# Altium footprint library connector.PcbLib: 227 footprints (part 1 of 15)
Each footprint in its own frame and in the unit in brackets; x right, y up, seen from the top. Pads: shape width x height; smd on the part's side, far side on the other; paste and mask are expansions set on the pad; w line width, h text height; cw(c..) or ccw(c..) is an arc to the next point about the centre after c.
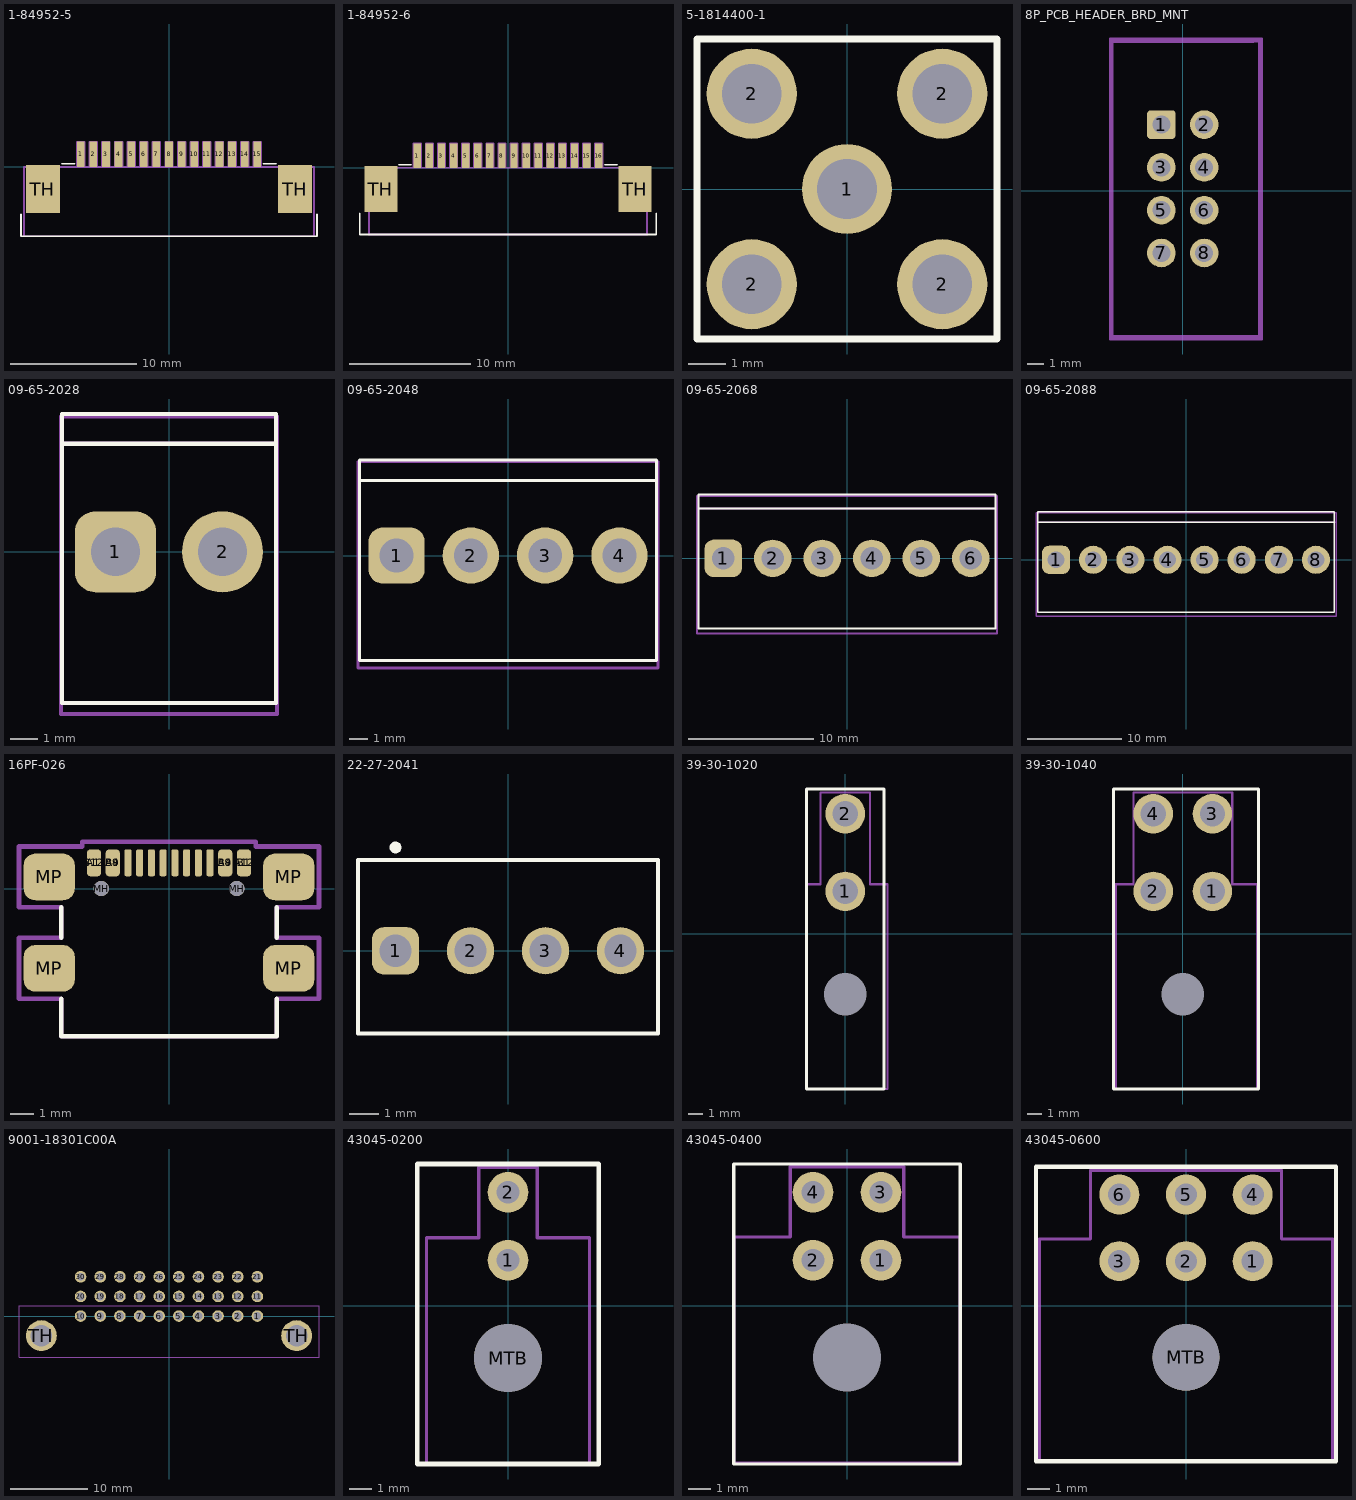
[diagram p0: the footprints below, top view; thin cyan lines are the x and y axes]

## 1-84952-5 [mm]
height 2.6
pads (17):
  rect 0.61x2 smd: 1(-7,1) 2(-6,1) 3(-5,1) 4(-4,1) 5(-3,1) 6(-2,1) 7(-1,1) 8(0,1) 9(1,1) 10(2,1) 11(3,1) 12(4,1) 13(5,1) 14(6,1) 15(7,1)
  rect 2.7x3.8 smd: TH(-10,-1.75) TH(10,-1.75)
Top Overlay:
  lines w0.15: -11.75,-3.75 -11.75,-5.5 0.5,-5.5 11.75,-5.5 11.75,-3.75 ; -8.5,0.25 -7.5,0.25 ; 7.5,0.25 8.5,0.25
Mechanical 29:
  lines w0.15: -7.3,0 -7.3,2 -6.7,2 -6.7,0 ; -6.3,0 -6.3,2 -5.7,2 -5.7,0 ; -5.3,0 -5.3,2 -4.7,2 -4.7,0 ; -4.3,0 -4.3,2 -3.7,2 -3.7,0 ; -3.3,0 -3.3,2 -2.7,2 -2.7,0 ; -2.3,0 -2.3,2 -1.7,2 -1.7,0 ; -1.3,0 -1.3,2 -0.7,2 -0.7,0 ; -0.3,0 -0.3,2 0.3,2 0.3,0 ; 0.7,0 0.7,2 1.3,2 1.3,0 ; 1.7,0 1.7,2 2.3,2 2.3,0 ; 2.7,0 2.7,2 3.3,2 3.3,0 ; 3.7,0 3.7,2 4.3,2 4.3,0 ; 4.7,0 4.7,2 5.3,2 5.3,0 ; 5.7,0 5.7,2 6.3,2 6.3,0 ; 6.7,0 6.7,2 7.3,2 7.3,0 ; -11.5,-5.5 11.5,-5.5 11.5,0 -11.5,0 -11.5,-5.5

## 1-84952-6 [mm]
height 2.6
pads (18):
  rect 0.61x2 smd: 1(-7.5,1) 2(-6.5,1) 3(-5.5,1) 4(-4.5,1) 5(-3.5,1) 6(-2.5,1) 7(-1.5,1) 8(-0.5,1) 9(0.5,1) 10(1.5,1) 11(2.5,1) 12(3.5,1) 13(4.5,1) 14(5.5,1) 15(6.5,1) 16(7.5,1)
  rect 2.7x3.8 smd: TH(-10.5,-1.75) TH(10.5,-1.75)
Top Overlay:
  lines w0.15: -12.25,-3.75 -12.25,-5.5 0.5,-5.5 12.25,-5.5 12.25,-3.75 ; -9,0.25 -8,0.25 ; 8,0.25 9,0.25
Mechanical 29:
  lines w0.15: -7.8,0 -7.8,2 -7.2,2 -7.2,0 ; -6.8,0 -6.8,2 -6.2,2 -6.2,0 ; -5.8,0 -5.8,2 -5.2,2 -5.2,0 ; -4.8,0 -4.8,2 -4.2,2 -4.2,0 ; -3.8,0 -3.8,2 -3.2,2 -3.2,0 ; -2.8,0 -2.8,2 -2.2,2 -2.2,0 ; -1.8,0 -1.8,2 -1.2,2 -1.2,0 ; -0.8,0 -0.8,2 -0.2,2 -0.2,0 ; 0.2,0 0.2,2 0.8,2 0.8,0 ; 1.2,0 1.2,2 1.8,2 1.8,0 ; 2.2,0 2.2,2 2.8,2 2.8,0 ; 3.2,0 3.2,2 3.8,2 3.8,0 ; 4.2,0 4.2,2 4.8,2 4.8,0 ; 5.2,0 5.2,2 5.8,2 5.8,0 ; 6.2,0 6.2,2 6.8,2 6.8,0 ; 7.2,0 7.2,2 7.8,2 7.8,0 ; -11.5,-5.5 -11.5,0 11.5,0 11.5,-5.5 -11.5,-5.5
  text ".Designator" at -2.5,-2.3 h1

## 5-1814400-1 [mm] "TE, SMA Connector Jack, Female Socket 50 Ohm Through Hole, Right Angle Solder"
height 10.43
pads (5):
  round 2.4 hole 1.6: 1(0,0) 2(-2.54,-2.54) 2(-2.54,2.54) 2(2.54,-2.54) 2(2.54,2.54)
Top Overlay:
  lines w0.2: -4,-4 4,-4 4,4 -4,4 -4,-4
3D body "c-5-1814400-1-d-3d.stp": height 10.43, standoff -3.1, extent -3.163,-11.05 3.164,3.15

## 8P_PCB_HEADER_BRD_MNT [mm] "HEADER BRD MNT 8POS 2.54MM"
height 10
pads (8):
  rrect25% 1.7x1.7 hole 1.067: 1(-1.27,3.937)
  round 1.7 hole 1.067: 2(1.27,3.937) 3(-1.27,1.397) 4(1.27,1.397) 5(-1.27,-1.143) 6(1.27,-1.143) 7(-1.27,-3.683) 8(1.27,-3.683)
Mechanical 15:
  lines w0.15: -4.318,-8.788 -4.318,9.017 4.699,9.017 4.699,-8.788 -4.318,-8.788
Mechanical 29:
  circle w0.15: c-1.27,3.937 r0.554
  circle w0.15: c1.27,3.937 r0.554
  circle w0.15: c-1.27,1.397 r0.554
  circle w0.15: c1.27,1.397 r0.554
  circle w0.15: c1.27,-1.143 r0.554
  circle w0.15: c1.27,-3.683 r0.554
  circle w0.15: c-1.27,-3.683 r0.554
  circle w0.15: c-1.27,-1.143 r0.554
  circle w0.15: c-1.27,1.397 r0.554
  lines w0.15: -4.064,-8.636 4.191,-8.636 ; -4.064,8.865 4.191,8.865 ; -4.225,-8.625 4.55,-8.625 4.55,8.9 -4.225,8.9 -4.225,-8.625 ; -4.191,-8.636 -4.191,8.89 4.572,8.89 4.572,-8.636 -4.191,-8.636
  text ".Designator" at -3,6.7 h1
3D body "User Library-8 pin IDC shrouded header V2.step": height 9.18, standoff -2.97, extent -4.475,-8.74 4.725,9.04

## 09-65-2028 [mm]
pads (2):
  rrect50% 3x3 hole 1.8: 1(-1.98,0)
  round 3 hole 1.8: 2(1.98,0)
Top Overlay:
  lines w0.15: -3.96,4 3.96,4 ; -3.96,-5.6 3.96,-5.6 3.96,5.1 -3.96,5.1 -3.96,-5.6
Mechanical 29:
  lines w0.15: -4,4 4,4 ; -4,-6 -4,5 4,5 4,-6 -4,-6
  text ".Designator" at -3.5,-0.3 h1
3D body "009652028.stp": height 13.85, standoff -3.6, extent -3.58,-5.6 3.58,5.15

## 09-65-2048 [mm]
height 12
pads (4):
  rrect50% 3x3 hole 1.8: 1(-5.94,0)
  round 3 hole 1.8: 2(-1.98,0) 3(1.98,0) 4(5.94,0)
Top Overlay:
  lines w0.15: -7.92,4 7.92,4 ; -7.92,-5.6 7.92,-5.6 7.92,5.1 -7.92,5.1 -7.92,-5.6
Mechanical 29:
  lines w0.15: 8,4 -8,4 -8,5 ; -8,5 8,5 8,-6 -8,-6 -8,5
  text ".Designator" at -3.5,-0.8 h1
3D body "009652048.stp": height 13.85, standoff -3.6, extent -7.515,-5.6 7.565,5.15

## 09-65-2068 [mm]
pads (6):
  rrect50% 3x3 hole 1.8: 1(-9.9,0)
  round 3 hole 1.8: 2(-5.94,0) 3(-1.98,0) 4(1.98,0) 5(5.94,0) 6(9.9,0)
Top Overlay:
  lines w0.15: -11.88,4 11.88,4 ; -11.88,-5.6 -11.88,5.1 11.88,5.1 11.88,-5.6 -11.88,-5.6
Mechanical 29:
  lines w0.15: 12,4 -12,4 -12,5 ; -12,5 -12,-6 12,-6 12,5 -12,5
  text ".Designator" at -3.5,-0.3 h1
3D body "009652068.stp": height 13.85, standoff -3.6, extent -11.5,-5.6 11.5,5.15

## 09-65-2088 [mm]
pads (8):
  rrect50% 3x3 hole 1.8: 1(-13.86,0)
  round 3 hole 1.8: 2(-9.9,0) 3(-5.94,0) 4(-1.98,0) 5(1.98,0) 6(5.94,0) 7(9.9,0) 8(13.86,0)
Top Overlay:
  lines w0.15: -15.84,4 15.84,4 ; -15.84,-5.6 15.84,-5.6 15.84,5.1 -15.84,5.1 -15.84,-5.6
Mechanical 29:
  lines w0.15: 16,4 -16,4 -16,5 ; -16,5 16,5 16,-6 -16,-6 -16,5
  text ".Designator" at -2,0.2 h1
3D body "009652088.stp": height 13.85, standoff -3.6, extent -15.46,-5.6 15.46,5.15

## 16PF-026 [mm]
pads (22):
  rrect50% 0.6x1.15 smd: A1(-3.2,1.1) A4(-2.4,1.1) A9(2.4,1.1) A12(3.2,1.1) B1(3.2,1.1) B4(2.4,1.1) B9(-2.4,1.1) B12(-3.2,1.1)
  rrect50% 0.3x1.15 smd: A5(-1.25,1.1) A6(-0.25,1.1) A7(0.25,1.1) A8(1.25,1.1) B5(1.75,1.1) B6(0.75,1.1) B7(-0.75,1.1) B8(-1.75,1.1)
  round 0.65 hole 0.65 unplated: MH(-2.89,0) MH(2.89,0)
  rrect50% 2.18x2 smd: MP(-5.11,-3.4) MP(-5.11,0.5) MP(5.11,-3.4) MP(5.11,0.5)
Top Overlay:
  lines w0.2: -4.6,-4.7 -4.6,-6.3 4.6,-6.3 4.6,-4.7 ; -4.6,-2.1 -4.6,-0.8 ; 4.6,-2.1 4.6,-0.8
  text "." at -4.452,1.598 h1.1
Top Courtyard:
  lines w0.2: -6.4,-4.7 -6.4,-2.1 -4.6,-2.1 -4.6,-0.8 -6.4,-0.8 -6.4,1.8 -3.7,1.8 -3.7,2 0,2 3.7,2 3.7,1.8 6.4,1.8 6.4,-0.8 4.6,-0.8 4.6,-2.1 6.4,-2.1 6.4,-4.7 4.6,-4.7 4.6,-6.3 0,-6.3 -4.6,-6.3 -4.6,-4.7 -6.4,-4.7
3D body "USB4110-GF-A--3DModel-STEP-56544.STEP": height 3.24, standoff -0.72, extent -5.65,-6.3 5.65,1.38

## 22-27-2041 [mm]
pads (4):
  rrect50% 1.6x1.6 hole 1.1: 1(-3.81,0)
  round 1.6 hole 1.1: 2(-1.27,0) 3(1.27,0) 4(3.81,0)
Top Overlay:
  circle w0.2: c-3.81,3.5 r0.1
  lines w0.15: -5.08,-2.8 5.08,-2.8 5.08,3.075 -5.08,3.075 -5.08,-2.8
3D body "022272041.stp": height 11.72, standoff -3.54, extent -5.105,-2.825 5.055,2.975

## 39-30-1020 [mm] "Mini-Fit Jr.пїЅ Header, Dual Row, Right Angle, with Snap-in Plastic Peg PCB Lock, 2 Circuits, PA Polyamide Nylon 6/6 94V-2, Tin (Sn) Plating"
height 9.6
pads (3):
  round 2.8 hole 1.8: 1(0,3) 2(0,8.5)
  round 0 hole 3 unplated: MTB(0,-4.3)
Top Overlay:
  lines w0.2: -2.75,-11 2.75,-11 2.75,10.25 -2.75,10.25 -2.75,-11
Top Courtyard:
  lines w0.15: -2.75,-11 0,-11 3,-11 3,3.5 1.75,3.5 1.75,10 0,10 -1.75,10 -1.75,3.5 -2.75,3.5 -2.75,-11
3D body "39-30-1020.stp": height 11.4, standoff -3.6, extent -2.75,-10.912 3.05,9.023

## 39-30-1040 [mm] "Mini-Fit Jr.пїЅ Header, Dual Row, Right Angle, with Snap-in Plastic Peg PCB Lock, 4 Circuits, PA Polyamide Nylon 6/6 94V-2, Tin (Sn) Plating"
height 9.6
pads (5):
  round 2.8 hole 1.8: 1(2.1,3) 2(-2.1,3) 3(2.1,8.5) 4(-2.1,8.5)
  round 0 hole 3 unplated: MTB(0,-4.3)
Top Overlay:
  lines w0.2: -4.9,-11 -4.9,10.25 5.35,10.25 5.35,-11 -4.9,-11
Top Courtyard:
  lines w0.15: -4.75,-11 -4.75,3.5 -3.5,3.5 -3.5,10 0,10 3.5,10 3.5,3.5 5.25,3.5 5.25,-11 0,-11 -4.75,-11
3D body "039301040.stp": height 11.4, standoff -3.6, extent -4.8,-10.9 5.2,9.035

## 9001-18301C00A [mm]
height 9
pads (32):
  round 1.5 hole 1: 1(11.43,0) 2(8.89,0) 3(6.35,0) 4(3.81,0) 5(1.27,0) 6(-1.27,0) 7(-3.81,0) 8(-6.35,0) 9(-8.89,0) 10(-11.43,0) 11(11.43,2.54) 12(8.89,2.54) 13(6.35,2.54) 14(3.81,2.54) 15(1.27,2.54) 16(-1.27,2.54) 17(-3.81,2.54) 18(-6.35,2.54) 19(-8.89,2.54) 20(-11.43,2.54) 21(11.43,5.08) 22(8.89,5.08) 23(6.35,5.08) 24(3.81,5.08) 25(1.27,5.08) 26(-1.27,5.08) 27(-3.81,5.08) 28(-6.35,5.08) 29(-8.89,5.08) 30(-11.43,5.08)
  round 4 hole 2.8: TH(-16.51,-2.54) TH(16.51,-2.54)
Mechanical 29:
  lines w0.15: -19.4,-5.3 -19.4,1.3 19.4,1.3 19.4,-5.3 -19.4,-5.3
  text ".Designator" at -5.5,-2.8 h1
3D body "0925_DIN_Type_3C_angled_male_30_pole.stp": height 9.35, standoff -3, extent -19.35,-12.64 19.35,5.38

## 43045-0200 [mm] "Molex, Micro-Fit 3.0пїЅ Right Angle Header, 3.00mm Pitch, Dual Row, 2 Circuits, with Snap-in Plastic Peg PCB Lock, Tin, Glow Wire Capable, Black"
height 8.77
pads (3):
  round 1.8 hole 1: 1(0,2) 2(0,5)
  round 3 hole 3 unplated: MTB(0,-2.32)
Top Overlay:
  lines w0.2: -4,-7 4,-7 4,6.25 -4,6.25 -4,-7
Top Courtyard:
  lines w0.15: -3.6,-7 -3.6,3 -1.3,3 -1.3,6.1 0,6.1 1.3,6.1 1.3,3 3.6,3 3.6,-7 0,-7 -3.6,-7
3D body "430450200.stp": height 8.77, standoff -3.18, extent -3.575,-6.92 3.575,5.32

## 43045-0400 [mm] "Molex, Micro-Fit 3.0пїЅ Right Angle Header, 3.00mm Pitch, Dual Row, 4 Circuits, with Snap-in Plastic Peg PCB Lock, Tin, Glow Wire Capable, Black"
height 8.77
pads (5):
  round 1.8 hole 1: 1(1.5,2) 2(-1.5,2) 3(1.5,5) 4(-1.5,5)
  round 0 hole 3 unplated: MTB(0,-2.3)
Top Overlay:
  lines w0.15: -5,-7 5,-7 5,6.25 -5,6.25 -5,-7
Top Courtyard:
  lines w0.15: -5,-6.975 -5,3.025 -2.5,3.025 -2.5,6.125 0,6.125 2.5,6.125 2.5,3.025 5,3.025 5,-6.975 0,-6.975 -5,-6.975
3D body "430450400.stp": height 8.77, standoff -3.18, extent -5.075,-6.92 5.075,5.32

## 43045-0600 [mm] "Molex, Micro-Fit 3.0пїЅ Right Angle Header, 3.00mm Pitch, Dual Row, 6 Circuits, with Snap-in Plastic Peg PCB Lock, Tin, Glow Wire Capable, Black"
height 8.77
pads (7):
  round 1.8 hole 1: 1(3,2) 2(0,2) 3(-3,2) 4(3,5) 5(0,5) 6(-3,5)
  round 3 hole 3 unplated: MTB(0,-2.325)
Top Overlay:
  lines w0.2: -6.75,-7 -6.75,6.25 6.75,6.25 6.75,-7 -6.75,-7
Top Courtyard:
  lines w0.15: -6.6,-7 0,-7 6.6,-7 6.6,3 4.3,3 4.3,6.1 0,6.1 -4.3,6.1 -4.3,3 -6.6,3 -6.6,-7
3D body "430450600.stp": height 8.77, standoff -3.18, extent -6.575,-6.92 6.575,5.32